# Altium footprint library pcb2D3D库101.PcbLib: 411 footprints (part 11 of 26)
Each footprint in its own frame and in the unit in brackets; x right, y up, seen from the top. Pads: shape width x height; smd on the part's side, far side on the other; paste and mask are expansions set on the pad; w line width, h text height; cw(c..) or ccw(c..) is an arc to the next point about the centre after c.
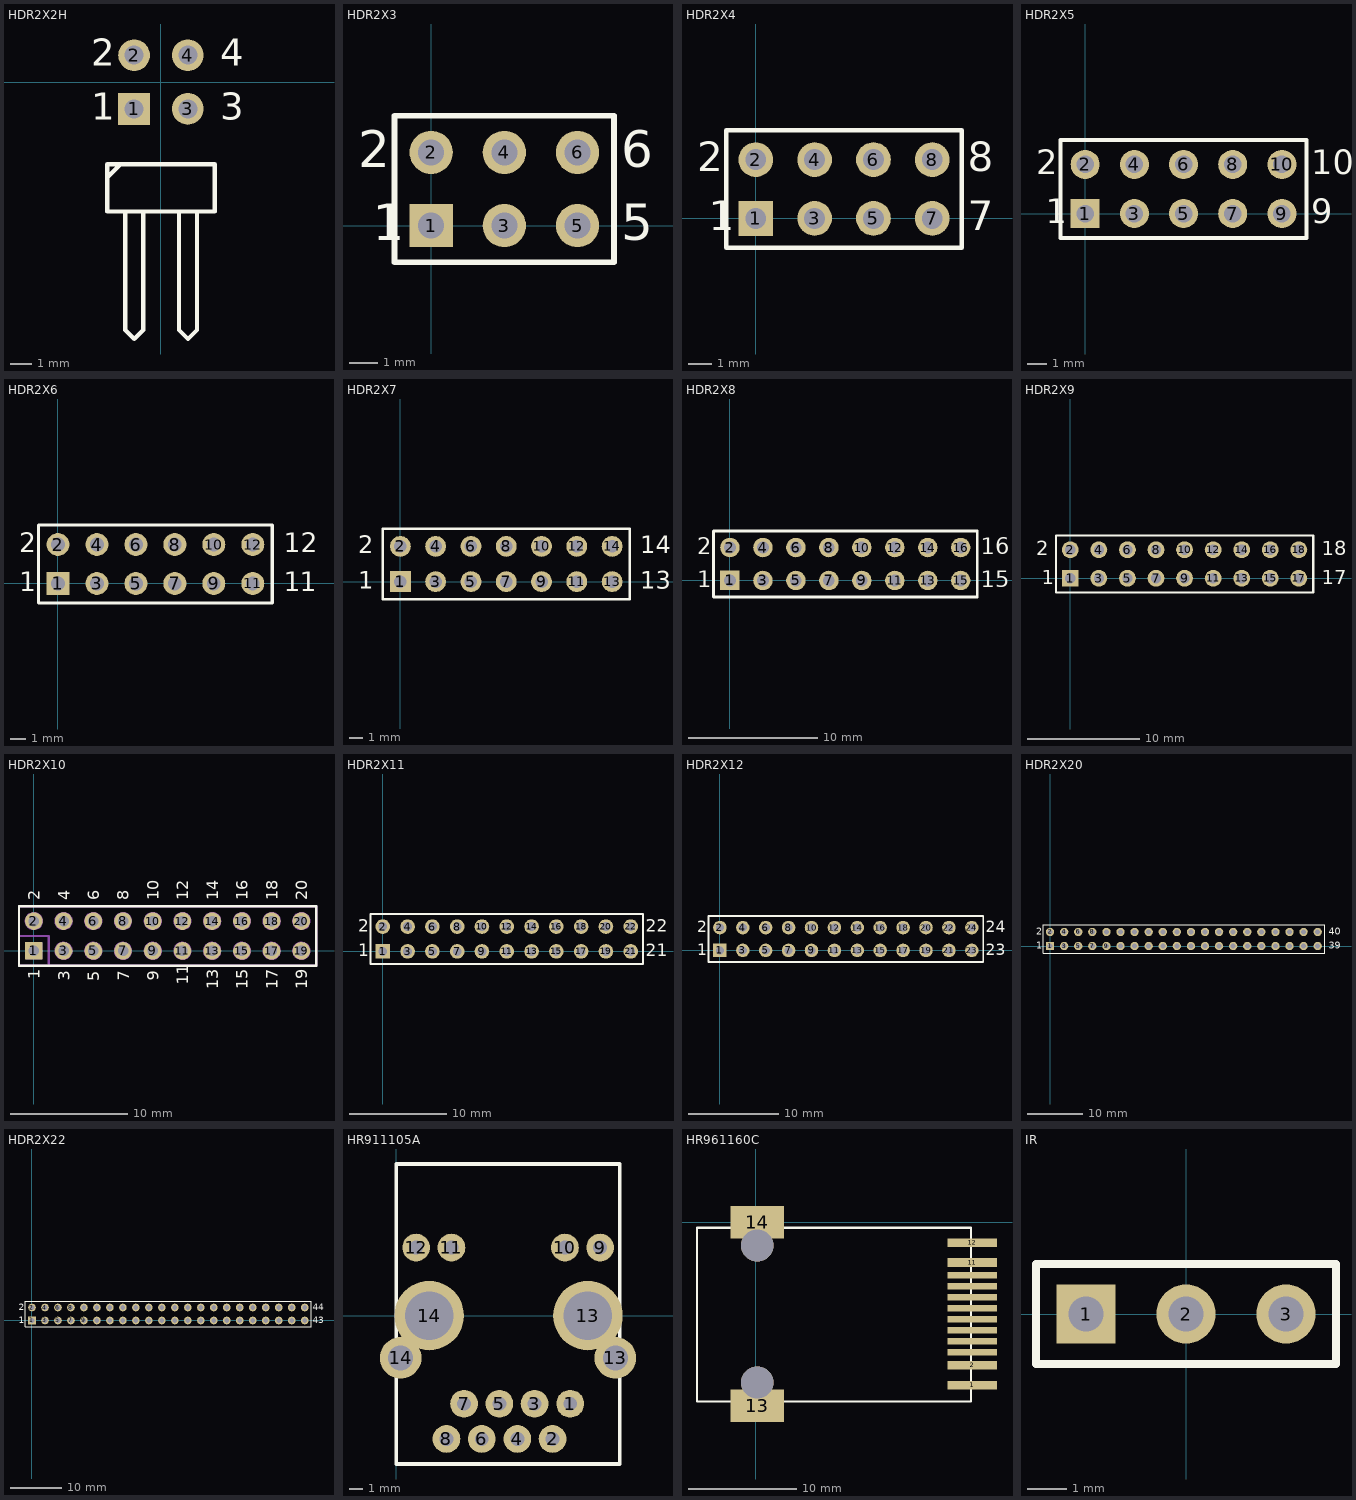
[diagram p10: the footprints below, top view; thin cyan lines are the x and y axes]

## HDR2X2H [mm]
pads (4):
  rect 1.5x1.5 hole 0.9: 1(-1.27,-1.27)
  round 1.5 hole 0.9: 2(-1.27,1.27) 3(1.27,-1.27) 4(1.27,1.27)
TopOverlay:
  lines w0.2: -2.54,-4.521 -1.905,-3.886 ; -1.685,-6.147 -1.685,-11.718 -1.262,-12.141 -0.838,-11.718 -0.838,-6.147 ; 0.855,-6.147 0.855,-11.718 1.278,-12.141 1.702,-11.718 1.702,-6.147 ; -2.54,-6.121 2.54,-6.121 2.54,-3.886 -2.54,-3.886 -2.54,-6.121
  text "3" at 2.794,-1.778 h1.27
  text "4" at 2.794,0.762 h1.27
  text "2" at -3.302,0.762 h1.27
  text "1" at -3.302,-1.778 h1.27
3D body "010883041.stp": height 5.54, standoff -2.84, extent -2.438,-12.205 2.388,1.638

## HDR2X3 [mm] "Connector; Header; 3x2 Position"
height 5.06
pads (6):
  rect 1.5x1.5 hole 0.9: 1(0,0)
  round 1.5 hole 0.9: 2(0,2.54) 3(2.54,0) 4(2.54,2.54) 5(5.08,0) 6(5.08,2.54)
TopOverlay:
  lines w0.2: 1.482,-1.27 6.35,-1.27 ; 6.35,-1.27 -1.27,-1.27 -1.27,3.81 6.35,3.81 6.35,-1.27
  text "1" at -2.032,-0.508 h1.27
  text "2" at -2.54,2.032 h1.27
  text "5" at 6.604,-0.508 h1.27
  text "6" at 6.604,2.032 h1.27
3D body "1001-3.STEP": height 8.54, standoff -3, extent -1.27,-1.27 6.35,1.27
3D body "1001-3.STEP": height 8.54, standoff -3, extent -1.219,1.219 6.401,3.759

## HDR2X4 [mm] "Connector; Header; 4x2 Position"
height 5.06
pads (8):
  rect 1.5x1.5 hole 0.9: 1(0,0)
  round 1.5 hole 0.9: 2(0,2.54) 3(2.54,0) 4(2.54,2.54) 5(5.08,0) 6(5.08,2.54) 7(7.62,0) 8(7.62,2.54)
TopOverlay:
  lines w0.2: -1.27,-1.27 -1.27,3.81 8.89,3.81 8.89,-1.27 -1.27,-1.27
  text "8" at 9.144,2.032 h1.27
  text "7" at 9.144,-0.508 h1.27
  text "1" at -2.032,-0.508 h1.27
  text "2" at -2.54,2.032 h1.27
3D body "1001-4.STEP": height 8.54, standoff -3, extent -1.219,1.245 8.941,3.785
3D body "1001-4.STEP": height 8.54, standoff -3, extent -1.219,-1.27 8.941,1.27

## HDR2X5 [mm] "Connector; Header; 5x2 Position"
height 5.06
pads (10):
  rect 1.5x1.5 hole 0.9: 1(0,0)
  round 1.5 hole 0.9: 2(0,2.54) 3(2.54,0) 4(2.54,2.54) 5(5.08,0) 6(5.08,2.54) 7(7.62,0) 8(7.62,2.54) 9(10.16,0) 10(10.16,2.54)
TopOverlay:
  lines w0.2: -1.27,-1.27 -1.27,3.81 11.43,3.81 11.43,-1.27 -1.27,-1.27
  text "2" at -2.54,2.032 h1.27
  text "1" at -2.032,-0.508 h1.27
  text "9" at 11.684,-0.508 h1.27
  text "10" at 11.684,2.032 h1.27
3D body "1001-5.STEP": height 8.54, standoff -3, extent -1.245,1.27 11.455,3.81
3D body "1001-5.STEP": height 8.54, standoff -3, extent -1.245,-1.27 11.455,1.27

## HDR2X6 [mm] "Connector; Header; 6x2 Position"
height 5.06
pads (12):
  rect 1.5x1.5 hole 0.9: 1(0,0)
  round 1.5 hole 0.9: 2(0,2.54) 3(2.54,0) 4(2.54,2.54) 5(5.08,0) 6(5.08,2.54) 7(7.62,0) 8(7.62,2.54) 9(10.16,0) 10(10.16,2.54) 11(12.7,0) 12(12.7,2.54)
TopOverlay:
  lines w0.2: -1.27,-1.27 13.97,-1.27 13.97,3.81 -1.27,3.81 -1.27,-1.27
  text "12" at 14.732,2.032 h1.27
  text "1" at 15.748,-0.508 h1.27
  text "1" at 14.732,-0.508 h1.27
  text "1" at -2.54,-0.508 h1.27
  text "2" at -2.54,2.032 h1.27
3D body "1001-6.STEP": height 8.54, standoff -3, extent -1.27,-1.27 13.97,1.27
3D body "1001-6.STEP": height 8.54, standoff -3, extent -1.27,1.27 13.97,3.81

## HDR2X7 [mm] "Connector; Header; 7x2 Position"
height 1
pads (14):
  rect 1.5x1.5 hole 0.9: 1(0,0)
  round 1.5 hole 0.9: 2(0,2.54) 3(2.54,0) 4(2.54,2.54) 5(5.08,0) 6(5.08,2.54) 7(7.62,0) 8(7.62,2.54) 9(10.16,0) 10(10.16,2.54) 11(12.7,0) 12(12.7,2.54) 13(15.24,0) 14(15.24,2.54)
TopOverlay:
  lines w0.2: -1.27,-1.27 -1.27,3.81 16.51,3.81 16.51,-1.27 -1.27,-1.27
  text "2" at -3.048,2.032 h1.27
  text "1" at -3.048,-0.508 h1.27
  text "14" at 17.272,2.032 h1.27
  text "13" at 17.272,-0.508 h1.27
3D body "1001-7.STEP": height 8.54, standoff -3, extent -1.27,-1.27 16.51,1.27
3D body "1001-7.STEP": height 8.54, standoff -3, extent -1.27,1.27 16.51,3.81

## HDR2X8 [mm] "Connector; Header; 8x2 Position"
height 1
pads (16):
  rect 1.5x1.5 hole 0.9: 1(0,0)
  round 1.5 hole 0.9: 2(0,2.54) 3(2.54,0) 4(2.54,2.54) 5(5.08,0) 6(5.08,2.54) 7(7.62,0) 8(7.62,2.54) 9(10.16,0) 10(10.16,2.54) 11(12.7,0) 12(12.7,2.54) 13(15.24,0) 14(15.24,2.54) 15(17.78,0) 16(17.78,2.54)
TopOverlay:
  lines w0.2: -1.27,-1.27 19.05,-1.27 19.05,3.81 -1.27,3.81 -1.27,-1.27
  text "16" at 19.304,2.032 h1.27
  text "15" at 19.304,-0.508 h1.27
  text "1" at -2.54,-0.508 h1.27
  text "2" at -2.54,2.032 h1.27
3D body "SW3DPS-HDR2X8-DEFAULT.STEP": height 8.38, standoff -3.81, extent -1.27,-1.295 19.05,3.785

## HDR2X9 [mm] "Connector; Header; 9x2 Position"
height 1
pads (18):
  rect 1.5x1.5 hole 0.9: 1(0,0)
  round 1.5 hole 0.9: 2(0,2.54) 3(2.54,0) 4(2.54,2.54) 5(5.08,0) 6(5.08,2.54) 7(7.62,0) 8(7.62,2.54) 9(10.16,0) 10(10.16,2.54) 11(12.7,0) 12(12.7,2.54) 13(15.24,0) 14(15.24,2.54) 15(17.78,0) 16(17.78,2.54) 17(20.32,0) 18(20.32,2.54)
TopOverlay:
  lines w0.2: -1.27,-1.27 -1.27,3.81 21.59,3.81 21.59,-1.27 -1.27,-1.27
  text "2" at -3.048,2.032 h1.27
  text "1" at -2.54,-0.508 h1.27
  text "17" at 22.352,-0.508 h1.27
  text "18" at 22.352,2.032 h1.27
3D body "1001-3.STEP": height 8.54, standoff -3, extent 13.97,-1.321 21.59,1.219
3D body "1001-3.STEP": height 8.54, standoff -3, extent 13.97,1.219 21.59,3.759
3D body "1001-6.STEP": height 8.54, standoff -3, extent -1.27,-1.321 13.97,1.219
3D body "1001-6.STEP": height 8.54, standoff -3, extent -1.27,1.219 13.97,3.759

## HDR2X10 [mm]
pads (20):
  rect 1.5x1.5 hole 0.9: 1(0,0)
  round 1.5 hole 0.9: 2(0,2.54) 3(2.54,0) 4(2.54,2.54) 5(5.08,0) 6(5.08,2.54) 7(7.62,0) 8(7.62,2.54) 9(10.16,0) 10(10.16,2.54) 11(12.7,0) 12(12.7,2.54) 13(15.24,0) 14(15.24,2.54) 15(17.78,0) 16(17.78,2.54) 17(20.32,0) 18(20.32,2.54) 19(22.86,0) 20(22.86,2.54)
TopOverlay:
  lines w0.2: -1.27,-1.27 -1.27,3.81 24.13,3.81 24.13,-1.27 -1.27,-1.27
  text "18" at 20.828,4.318 h1
  text "17" at 20.828,-3.302 h1
  text "14" at 15.748,4.318 h1
  text "13" at 15.748,-3.302 h1
  text "10" at 10.668,4.318 h1
  text "9" at 10.674,-2.539 h1
  text "8" at 8.128,4.318 h1
  text "7" at 8.134,-2.565 h1
  text "4" at 3.048,4.318 h1
  text "3" at 3.054,-2.565 h1
  text "5" at 5.594,-2.59 h1
  text "11" at 13.208,-2.921 h1
  text "15" at 18.288,-3.302 h1
  text "6" at 5.588,4.318 h1
  text "12" at 13.208,4.318 h1
  text "16" at 18.288,4.318 h1
  text "20" at 23.368,4.318 h1
  text "19" at 23.368,-3.302 h1
  text "1" at 0.514,-2.412 h1
  text "2" at 0.508,4.318 h1
Mechanical7:
  circle w0.2: c2.54,0 r0.684
  circle w0.2: c5.08,0 r0.684
  circle w0.2: c7.62,0 r0.684
  circle w0.2: c10.16,0 r0.684
  circle w0.2: c12.7,0 r0.684
  circle w0.2: c15.24,0 r0.684
  circle w0.2: c17.78,0 r0.684
  circle w0.2: c20.32,0 r0.684
  circle w0.2: c22.86,0 r0.684
  circle w0.2: c22.86,2.54 r0.684
  circle w0.2: c20.32,2.54 r0.684
  circle w0.2: c17.78,2.54 r0.684
  circle w0.2: c15.24,2.54 r0.684
  circle w0.2: c12.7,2.54 r0.684
  circle w0.2: c10.16,2.54 r0.684
  circle w0.2: c7.62,2.54 r0.684
  circle w0.2: c5.08,2.54 r0.684
  circle w0.2: c2.54,2.54 r0.684
  circle w0.2: c0,2.54 r0.684
  lines w0.2: -1.27,1.27 1.27,1.27 1.27,-1.27 ; -1.27,-1.27 -1.27,3.81 24.13,3.81 24.13,-1.27 -1.27,-1.27 ; -0.635,-0.635 -0.635,0.635 0.635,0.635 0.635,-0.635 -0.635,-0.635
3D body "HDR 20 pin.STEP": height 8.38, standoff -2.54, extent -1.275,-1.263 24.125,3.817

## HDR2X11 [mm] "Connector; Header; 11x2 Position"
height 1
pads (22):
  rect 1.5x1.5 hole 0.9: 1(0,0)
  round 1.5 hole 0.9: 2(0,2.54) 3(2.54,0) 4(2.54,2.54) 5(5.08,0) 6(5.08,2.54) 7(7.62,0) 8(7.62,2.54) 9(10.16,0) 10(10.16,2.54) 11(12.7,0) 12(12.7,2.54) 13(15.24,0) 14(15.24,2.54) 15(17.78,0) 16(17.78,2.54) 17(20.32,0) 18(20.32,2.54) 19(22.86,0) 20(22.86,2.54) 21(25.4,0) 22(25.4,2.54)
TopOverlay:
  lines w0.2: -1.27,-1.27 26.67,-1.27 26.67,3.81 -1.27,3.81 -1.27,-1.27
  text "22" at 26.924,2.032 h1.27
  text "21" at 26.924,-0.508 h1.27
  text "2" at -2.54,2.032 h1.27
  text "1" at -2.54,-0.508 h1.27
3D body "1001-7.STEP": height 8.54, standoff -3, extent -1.27,-1.27 16.51,1.27
3D body "1001-7.STEP": height 8.54, standoff -3, extent -1.27,1.27 16.51,3.81
3D body "1001-4.STEP": height 8.54, standoff -3, extent 16.51,1.27 26.67,3.81
3D body "1001-4.STEP": height 8.54, standoff -3, extent 16.51,-1.27 26.67,1.27

## HDR2X12 [mm] "Connector; Header; 12x2 Position"
height 1
pads (24):
  rect 1.5x1.5 hole 0.9: 1(0,0)
  round 1.5 hole 0.9: 2(0,2.54) 3(2.54,0) 4(2.54,2.54) 5(5.08,0) 6(5.08,2.54) 7(7.62,0) 8(7.62,2.54) 9(10.16,0) 10(10.16,2.54) 11(12.7,0) 12(12.7,2.54) 13(15.24,0) 14(15.24,2.54) 15(17.78,0) 16(17.78,2.54) 17(20.32,0) 18(20.32,2.54) 19(22.86,0) 20(22.86,2.54) 21(25.4,0) 22(25.4,2.54) 23(27.94,0) 24(27.94,2.54)
TopOverlay:
  lines w0.2: -1.27,-1.27 29.21,-1.27 29.21,3.81 -1.27,3.81 -1.27,-1.27
  text "24" at 29.464,2.032 h1.27
  text "23" at 29.464,-0.508 h1.27
  text "2" at -2.54,2.032 h1.27
  text "1" at -2.54,-0.508 h1.27
3D body "1001-6.STEP": height 8.54, standoff -3, extent 13.97,-1.27 29.21,1.27
3D body "1001-6.STEP": height 8.54, standoff -3, extent 13.97,1.27 29.21,3.81
3D body "1001-6.STEP": height 8.54, standoff -3, extent -1.27,-1.27 13.97,1.27
3D body "1001-6.STEP": height 8.54, standoff -3, extent -1.27,1.27 13.97,3.81

## HDR2X20 [mm]
pads (40):
  rect 1.5x1.5 hole 0.9: 1(0,0)
  round 1.5 hole 0.9: 2(0,2.54) 3(2.54,0) 4(2.54,2.54) 5(5.08,0) 6(5.08,2.54) 7(7.62,0) 8(7.62,2.54) 9(10.16,0) 10(10.16,2.54) 11(12.7,0) 12(12.7,2.54) 13(15.24,0) 14(15.24,2.54) 15(17.78,0) 16(17.78,2.54) 17(20.32,0) 18(20.32,2.54) 19(22.86,0) 20(22.86,2.54) 21(25.4,0) 22(25.4,2.54) 23(27.94,0) 24(27.94,2.54) 25(30.48,0) 26(30.48,2.54) 27(33.02,0) 28(33.02,2.54) 29(35.56,0) 30(35.56,2.54) 31(38.1,0) 32(38.1,2.54) 33(40.64,0) 34(40.64,2.54) 35(43.18,0) 36(43.18,2.54) 37(45.72,0) 38(45.72,2.54) 39(48.26,0) 40(48.26,2.54)
TopOverlay:
  lines w0.2: -1.27,-1.27 -1.27,3.81 49.53,3.81 49.53,-1.27 -1.27,-1.27
  text "39" at 50.292,-0.508 h1.27
  text "40" at 50.292,2.032 h1.27
  text "2" at -2.54,2.032 h1.27
  text "1" at -2.54,-0.508 h1.27
3D body "SW3DPS-HDR2X5-DEFAULT.STEP": height 8.38, standoff -3.81, extent 36.83,-1.27 49.53,3.81
3D body "SW3DPS-HDR2X5-DEFAULT.STEP": height 8.38, standoff -3.81, extent 24.13,-1.321 36.83,3.759
3D body "SW3DPS-HDR2X5-DEFAULT.STEP": height 8.38, standoff -3.81, extent 11.405,-1.321 24.105,3.759
3D body "SW3DPS-HDR2X5-DEFAULT.STEP": height 8.38, standoff -3.81, extent -1.295,-1.295 11.405,3.785

## HDR2X22 [mm]
pads (44):
  rect 1.5x1.5 hole 0.9: 1(0,0)
  round 1.5 hole 0.9: 2(0,2.54) 3(2.54,0) 4(2.54,2.54) 5(5.08,0) 6(5.08,2.54) 7(7.62,0) 8(7.62,2.54) 9(10.16,0) 10(10.16,2.54) 11(12.7,0) 12(12.7,2.54) 13(15.24,0) 14(15.24,2.54) 15(17.78,0) 16(17.78,2.54) 17(20.32,0) 18(20.32,2.54) 19(22.86,0) 20(22.86,2.54) 21(25.4,0) 22(25.4,2.54) 23(27.94,0) 24(27.94,2.54) 25(30.48,0) 26(30.48,2.54) 27(33.02,0) 28(33.02,2.54) 29(35.56,0) 30(35.56,2.54) 31(38.1,0) 32(38.1,2.54) 33(40.64,0) 34(40.64,2.54) 35(43.18,0) 36(43.18,2.54) 37(45.72,0) 38(45.72,2.54) 39(48.26,0) 40(48.26,2.54) 41(50.8,0) 42(50.8,2.54) 43(53.34,0) 44(53.34,2.54)
TopOverlay:
  lines w0.2: -1.27,-1.27 54.61,-1.27 54.61,3.81 -1.27,3.81 -1.27,-1.27
  text "2" at -2.54,2.032 h1.27
  text "1" at -2.54,-0.508 h1.27
  text "44" at 54.864,2.032 h1.27
  text "43" at 54.864,-0.508 h1.27
3D body "SW3DPS-HDR2X5-DEFAULT.STEP": height 8.38, standoff -3.81, extent 36.804,-1.295 49.504,3.785
3D body "SW3DPS-HDR2X5-DEFAULT.STEP": height 8.38, standoff -3.81, extent 24.079,-1.321 36.779,3.759
3D body "SW3DPS-HDR2X5-DEFAULT.STEP": height 8.38, standoff -3.81, extent 11.379,-1.295 24.079,3.785
3D body "SW3DPS-HDR2X5-DEFAULT.STEP": height 8.38, standoff -3.81, extent -1.27,-1.295 11.43,3.785
3D body "SW3DPS-HDR2X2-DEFAULT.STEP": height 8.38, standoff -3.81, extent 49.504,-1.27 54.584,3.81

## HR911105A [mm] "网络变压器"
pads (16):
  round 2 hole 1: 1(12.522,-6.35) 2(11.252,-8.89) 3(9.957,-6.35) 4(8.712,-8.89) 5(7.417,-6.35) 6(6.147,-8.89) 7(4.877,-6.35) 8(3.607,-8.89) 9(14.681,4.902) 10(12.141,4.902) 11(3.962,4.902) 12(1.422,4.902)
  round 5 hole 3.5: 13(13.792,0) 14(2.362,0)
  round 3 hole 1.8: 13(15.773,-3.048) 14(0.305,-3.048)
TopOverlay:
  lines w0.254: -0.025,-10.693 -0.025,10.922 16.104,10.922 16.104,-10.693 -0.025,-10.693
3D body "User Library-RMS-001L-08A0-GY.STEP": height 2.3, standoff -14.5, extent -0.025,-10.498 15.975,10.802

## HR961160C [mm] "RJ45"
pads (14):
  rect 4.6x0.8 smd: 1(20.066,-15.113) 2(20.066,-13.273) 11(20.066,-3.733) 12(20.066,-1.893)
  rect 4.6x0.61 smd: 3(20.066,-12.073) 4(20.066,-11.053) 5(20.066,-10.033) 6(20.066,-9.013) 7(20.066,-7.993) 8(20.066,-6.973) 9(20.066,-5.953) 10(20.066,-4.933)
  rect 5x3 smd: 13(0.127,-17.018) 14(0.127,0)
via 0.127,-2.159 diameter 3 hole 3
via 0.127,-14.859 diameter 3 hole 3
TopOverlay:
  lines w0.2: -5.461,-16.637 -5.461,-0.508 19.939,-0.508 19.939,-16.637 -5.461,-16.637
3D body "User Library-RJ45.step": height 14.7, standoff -0.5, extent -5.207,-18.009 21.793,0.991

## IR [mm]
pads (3):
  rect 1.5x1.5 hole 0.9: 1(-2.54,0)
  round 1.5 hole 0.9: 2(0,0) 3(2.54,0)
TopOverlay:
  lines w0.2: -3.81,-1.27 -3.81,1.27 3.81,1.27 3.81,-1.27 -3.81,-1.27
3D body "User Library-IR reciver.STEP": height 10.48, standoff -2.63, extent -3.025,-3.997 2.975,3.789